# Altium footprint library ICs_imp.PCBLIB: 118 footprints (part 3 of 8)
Each footprint in its own frame and in the unit in brackets; x right, y up, seen from the top. Pads: shape width x height; smd on the part's side, far side on the other; paste and mask are expansions set on the pad; w line width, h text height; cw(c..) or ccw(c..) is an arc to the next point about the centre after c.
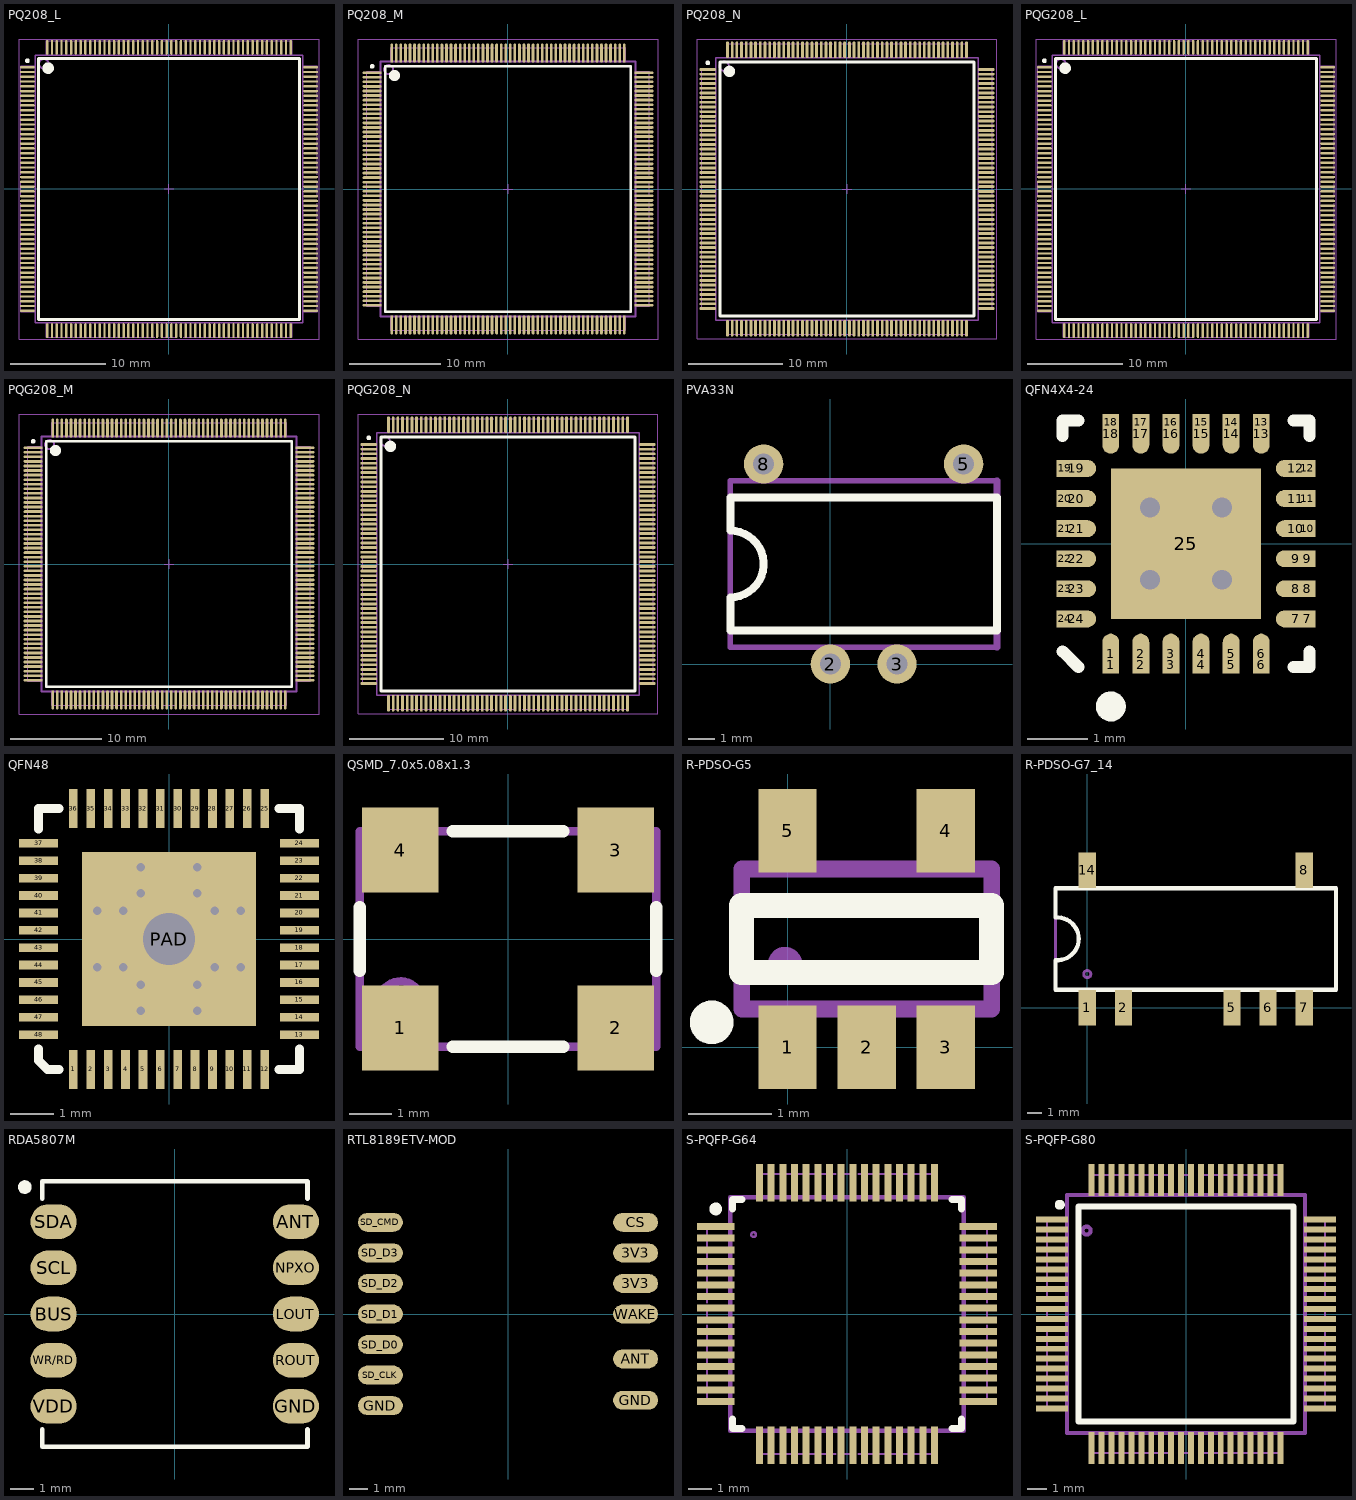
[diagram p2: the footprints below, top view; thin cyan lines are the x and y axes]

## PQ208_L [mm] "Shrink QFP, 208-Leads, Body 28x28mm, Pitch 0.5mm, IPC High Density"
height 4.1
pads (208):
  oval 1.55x0.25 smd: 1(-14.825,12.75) 2(-14.825,12.25) 3(-14.825,11.75) 4(-14.825,11.25) 5(-14.825,10.75) 6(-14.825,10.25) 7(-14.825,9.75) 8(-14.825,9.25) 9(-14.825,8.75) 10(-14.825,8.25) 11(-14.825,7.75) 12(-14.825,7.25) 13(-14.825,6.75) 14(-14.825,6.25) 15(-14.825,5.75) 16(-14.825,5.25) 17(-14.825,4.75) 18(-14.825,4.25) 19(-14.825,3.75) 20(-14.825,3.25) 21(-14.825,2.75) 22(-14.825,2.25) 23(-14.825,1.75) 24(-14.825,1.25) 25(-14.825,0.75) 26(-14.825,0.25) 27(-14.825,-0.25) 28(-14.825,-0.75) 29(-14.825,-1.25) 30(-14.825,-1.75) 31(-14.825,-2.25) 32(-14.825,-2.75) 33(-14.825,-3.25) 34(-14.825,-3.75) 35(-14.825,-4.25) 36(-14.825,-4.75) 37(-14.825,-5.25) 38(-14.825,-5.75) 39(-14.825,-6.25) 40(-14.825,-6.75) 41(-14.825,-7.25) 42(-14.825,-7.75) 43(-14.825,-8.25) 44(-14.825,-8.75) 45(-14.825,-9.25) 46(-14.825,-9.75) 47(-14.825,-10.25) 48(-14.825,-10.75) 49(-14.825,-11.25) 50(-14.825,-11.75) 51(-14.825,-12.25) 52(-14.825,-12.75) 105(14.825,-12.75) 106(14.825,-12.25) 107(14.825,-11.75) 108(14.825,-11.25) 109(14.825,-10.75) 110(14.825,-10.25) 111(14.825,-9.75) 112(14.825,-9.25) 113(14.825,-8.75) 114(14.825,-8.25) 115(14.825,-7.75) 116(14.825,-7.25) 117(14.825,-6.75) 118(14.825,-6.25) 119(14.825,-5.75) 120(14.825,-5.25) 121(14.825,-4.75) 122(14.825,-4.25) 123(14.825,-3.75) 124(14.825,-3.25) 125(14.825,-2.75) 126(14.825,-2.25) 127(14.825,-1.75) 128(14.825,-1.25) 129(14.825,-0.75) 130(14.825,-0.25) 131(14.825,0.25) 132(14.825,0.75) 133(14.825,1.25) 134(14.825,1.75) 135(14.825,2.25) 136(14.825,2.75) 137(14.825,3.25) 138(14.825,3.75) 139(14.825,4.25) 140(14.825,4.75) 141(14.825,5.25) 142(14.825,5.75) 143(14.825,6.25) 144(14.825,6.75) 145(14.825,7.25) 146(14.825,7.75) 147(14.825,8.25) 148(14.825,8.75) 149(14.825,9.25) 150(14.825,9.75) 151(14.825,10.25) 152(14.825,10.75) 153(14.825,11.25) 154(14.825,11.75) 155(14.825,12.25) 156(14.825,12.75)
  oval 0.25x1.55 smd: 53(-12.75,-14.825) 54(-12.25,-14.825) 55(-11.75,-14.825) 56(-11.25,-14.825) 57(-10.75,-14.825) 58(-10.25,-14.825) 59(-9.75,-14.825) 60(-9.25,-14.825) 61(-8.75,-14.825) 62(-8.25,-14.825) 63(-7.75,-14.825) 64(-7.25,-14.825) 65(-6.75,-14.825) 66(-6.25,-14.825) 67(-5.75,-14.825) 68(-5.25,-14.825) 69(-4.75,-14.825) 70(-4.25,-14.825) 71(-3.75,-14.825) 72(-3.25,-14.825) 73(-2.75,-14.825) 74(-2.25,-14.825) 75(-1.75,-14.825) 76(-1.25,-14.825) 77(-0.75,-14.825) 78(-0.25,-14.825) 79(0.25,-14.825) 80(0.75,-14.825) 81(1.25,-14.825) 82(1.75,-14.825) 83(2.25,-14.825) 84(2.75,-14.825) 85(3.25,-14.825) 86(3.75,-14.825) 87(4.25,-14.825) 88(4.75,-14.825) 89(5.25,-14.825) 90(5.75,-14.825) 91(6.25,-14.825) 92(6.75,-14.825) 93(7.25,-14.825) 94(7.75,-14.825) 95(8.25,-14.825) 96(8.75,-14.825) 97(9.25,-14.825) 98(9.75,-14.825) 99(10.25,-14.825) 100(10.75,-14.825) 101(11.25,-14.825) 102(11.75,-14.825) 103(12.25,-14.825) 104(12.75,-14.825) 157(12.75,14.825) 158(12.25,14.825) 159(11.75,14.825) 160(11.25,14.825) 161(10.75,14.825) 162(10.25,14.825) 163(9.75,14.825) 164(9.25,14.825) 165(8.75,14.825) 166(8.25,14.825) 167(7.75,14.825) 168(7.25,14.825) 169(6.75,14.825) 170(6.25,14.825) 171(5.75,14.825) 172(5.25,14.825) 173(4.75,14.825) 174(4.25,14.825) 175(3.75,14.825) 176(3.25,14.825) 177(2.75,14.825) 178(2.25,14.825) 179(1.75,14.825) 180(1.25,14.825) 181(0.75,14.825) 182(0.25,14.825) 183(-0.25,14.825) 184(-0.75,14.825) 185(-1.25,14.825) 186(-1.75,14.825) 187(-2.25,14.825) 188(-2.75,14.825) 189(-3.25,14.825) 190(-3.75,14.825) 191(-4.25,14.825) 192(-4.75,14.825) 193(-5.25,14.825) 194(-5.75,14.825) 195(-6.25,14.825) 196(-6.75,14.825) 197(-7.25,14.825) 198(-7.75,14.825) 199(-8.25,14.825) 200(-8.75,14.825) 201(-9.25,14.825) 202(-9.75,14.825) 203(-10.25,14.825) 204(-10.75,14.825) 205(-11.25,14.825) 206(-11.75,14.825) 207(-12.25,14.825) 208(-12.75,14.825)
Top Overlay:
  circle w0.6: c-12.65,12.65 r0.3
  circle w0.25: c-14.825,13.425 r0.125
  lines w0.3: -13.65,-13.65 13.65,-13.65 13.65,13.65 -13.65,13.65 -13.65,-13.65
Mechanical 1:
  circle w0.2: c-13.1,13.1 r0.5
  lines w0.1: -15.494,-12.827 -15.494,-1.5 ; -15.494,-0.762 -15.494,0.762 ; -15.494,1.5 -15.494,12.827 ; -12.827,-15.494 -1.5,-15.494 ; -12.827,15.494 -1.5,15.494 ; -0.762,-15.494 0.762,-15.494 ; -0.762,15.494 0.762,15.494 ; 1.5,-15.494 12.827,-15.494 ; 1.5,15.494 12.827,15.494 ; 15.494,-12.827 15.494,-1.5 ; 15.494,-0.762 15.494,0.762 ; 15.494,1.5 15.494,12.827
  lines w0.2: -15.494,-12.827 -14,-12.827 ; -15.494,12.827 -14,12.827 ; -12.827,-15.494 -12.827,-14 ; -12.827,14 -12.827,15.494 ; 12.827,-15.494 12.827,-14 ; 12.827,14 12.827,15.494 ; 14,-12.827 15.494,-12.827 ; 14,12.827 15.494,12.827 ; -14,-14 14,-14 14,14 -14,14 -14,-14
  text ".Comment" at -2.9,-1.7 h1.5
  text ".Designator" at -1.61,0.85 h1.5
Mechanical 15:
  lines w0.1: -0.5,0 0.5,0 ; 0,-0.5 0,0.5 ; -15.7,-15.7 15.7,-15.7 15.7,15.7 -15.7,15.7 -15.7,-15.7
3D body: height 4.1, standoff 0, extent -14,-14 14,14

## PQ208_M [mm] "Shrink QFP, 208-Leads, Body 28x28mm, Pitch 0.5mm, IPC Low Density"
height 4.1
pads (208):
  oval 2.1x0.3 smd: 1(-14.9,12.75) 2(-14.9,12.25) 3(-14.9,11.75) 4(-14.9,11.25) 5(-14.9,10.75) 6(-14.9,10.25) 7(-14.9,9.75) 8(-14.9,9.25) 9(-14.9,8.75) 10(-14.9,8.25) 11(-14.9,7.75) 12(-14.9,7.25) 13(-14.9,6.75) 14(-14.9,6.25) 15(-14.9,5.75) 16(-14.9,5.25) 17(-14.9,4.75) 18(-14.9,4.25) 19(-14.9,3.75) 20(-14.9,3.25) 21(-14.9,2.75) 22(-14.9,2.25) 23(-14.9,1.75) 24(-14.9,1.25) 25(-14.9,0.75) 26(-14.9,0.25) 27(-14.9,-0.25) 28(-14.9,-0.75) 29(-14.9,-1.25) 30(-14.9,-1.75) 31(-14.9,-2.25) 32(-14.9,-2.75) 33(-14.9,-3.25) 34(-14.9,-3.75) 35(-14.9,-4.25) 36(-14.9,-4.75) 37(-14.9,-5.25) 38(-14.9,-5.75) 39(-14.9,-6.25) 40(-14.9,-6.75) 41(-14.9,-7.25) 42(-14.9,-7.75) 43(-14.9,-8.25) 44(-14.9,-8.75) 45(-14.9,-9.25) 46(-14.9,-9.75) 47(-14.9,-10.25) 48(-14.9,-10.75) 49(-14.9,-11.25) 50(-14.9,-11.75) 51(-14.9,-12.25) 52(-14.9,-12.75) 105(14.9,-12.75) 106(14.9,-12.25) 107(14.9,-11.75) 108(14.9,-11.25) 109(14.9,-10.75) 110(14.9,-10.25) 111(14.9,-9.75) 112(14.9,-9.25) 113(14.9,-8.75) 114(14.9,-8.25) 115(14.9,-7.75) 116(14.9,-7.25) 117(14.9,-6.75) 118(14.9,-6.25) 119(14.9,-5.75) 120(14.9,-5.25) 121(14.9,-4.75) 122(14.9,-4.25) 123(14.9,-3.75) 124(14.9,-3.25) 125(14.9,-2.75) 126(14.9,-2.25) 127(14.9,-1.75) 128(14.9,-1.25) 129(14.9,-0.75) 130(14.9,-0.25) 131(14.9,0.25) 132(14.9,0.75) 133(14.9,1.25) 134(14.9,1.75) 135(14.9,2.25) 136(14.9,2.75) 137(14.9,3.25) 138(14.9,3.75) 139(14.9,4.25) 140(14.9,4.75) 141(14.9,5.25) 142(14.9,5.75) 143(14.9,6.25) 144(14.9,6.75) 145(14.9,7.25) 146(14.9,7.75) 147(14.9,8.25) 148(14.9,8.75) 149(14.9,9.25) 150(14.9,9.75) 151(14.9,10.25) 152(14.9,10.75) 153(14.9,11.25) 154(14.9,11.75) 155(14.9,12.25) 156(14.9,12.75)
  oval 0.3x2.1 smd: 53(-12.75,-14.9) 54(-12.25,-14.9) 55(-11.75,-14.9) 56(-11.25,-14.9) 57(-10.75,-14.9) 58(-10.25,-14.9) 59(-9.75,-14.9) 60(-9.25,-14.9) 61(-8.75,-14.9) 62(-8.25,-14.9) 63(-7.75,-14.9) 64(-7.25,-14.9) 65(-6.75,-14.9) 66(-6.25,-14.9) 67(-5.75,-14.9) 68(-5.25,-14.9) 69(-4.75,-14.9) 70(-4.25,-14.9) 71(-3.75,-14.9) 72(-3.25,-14.9) 73(-2.75,-14.9) 74(-2.25,-14.9) 75(-1.75,-14.9) 76(-1.25,-14.9) 77(-0.75,-14.9) 78(-0.25,-14.9) 79(0.25,-14.9) 80(0.75,-14.9) 81(1.25,-14.9) 82(1.75,-14.9) 83(2.25,-14.9) 84(2.75,-14.9) 85(3.25,-14.9) 86(3.75,-14.9) 87(4.25,-14.9) 88(4.75,-14.9) 89(5.25,-14.9) 90(5.75,-14.9) 91(6.25,-14.9) 92(6.75,-14.9) 93(7.25,-14.9) 94(7.75,-14.9) 95(8.25,-14.9) 96(8.75,-14.9) 97(9.25,-14.9) 98(9.75,-14.9) 99(10.25,-14.9) 100(10.75,-14.9) 101(11.25,-14.9) 102(11.75,-14.9) 103(12.25,-14.9) 104(12.75,-14.9) 157(12.75,14.9) 158(12.25,14.9) 159(11.75,14.9) 160(11.25,14.9) 161(10.75,14.9) 162(10.25,14.9) 163(9.75,14.9) 164(9.25,14.9) 165(8.75,14.9) 166(8.25,14.9) 167(7.75,14.9) 168(7.25,14.9) 169(6.75,14.9) 170(6.25,14.9) 171(5.75,14.9) 172(5.25,14.9) 173(4.75,14.9) 174(4.25,14.9) 175(3.75,14.9) 176(3.25,14.9) 177(2.75,14.9) 178(2.25,14.9) 179(1.75,14.9) 180(1.25,14.9) 181(0.75,14.9) 182(0.25,14.9) 183(-0.25,14.9) 184(-0.75,14.9) 185(-1.25,14.9) 186(-1.75,14.9) 187(-2.25,14.9) 188(-2.75,14.9) 189(-3.25,14.9) 190(-3.75,14.9) 191(-4.25,14.9) 192(-4.75,14.9) 193(-5.25,14.9) 194(-5.75,14.9) 195(-6.25,14.9) 196(-6.75,14.9) 197(-7.25,14.9) 198(-7.75,14.9) 199(-8.25,14.9) 200(-8.75,14.9) 201(-9.25,14.9) 202(-9.75,14.9) 203(-10.25,14.9) 204(-10.75,14.9) 205(-11.25,14.9) 206(-11.75,14.9) 207(-12.25,14.9) 208(-12.75,14.9)
Top Overlay:
  circle w0.6: c-12.45,12.45 r0.3
  circle w0.25: c-14.9,13.45 r0.125
  lines w0.3: -13.45,-13.45 13.45,-13.45 13.45,13.45 -13.45,13.45 -13.45,-13.45
Mechanical 1:
  circle w0.2: c-13.1,13.1 r0.5
  lines w0.1: -15.494,-12.827 -15.494,-1.5 ; -15.494,-0.762 -15.494,0.762 ; -15.494,1.5 -15.494,12.827 ; -12.827,-15.494 -1.5,-15.494 ; -12.827,15.494 -1.5,15.494 ; -0.762,-15.494 0.762,-15.494 ; -0.762,15.494 0.762,15.494 ; 1.5,-15.494 12.827,-15.494 ; 1.5,15.494 12.827,15.494 ; 15.494,-12.827 15.494,-1.5 ; 15.494,-0.762 15.494,0.762 ; 15.494,1.5 15.494,12.827
  lines w0.2: -15.494,-12.827 -14,-12.827 ; -15.494,12.827 -14,12.827 ; -12.827,-15.494 -12.827,-14 ; -12.827,14 -12.827,15.494 ; 12.827,-15.494 12.827,-14 ; 12.827,14 12.827,15.494 ; 14,-12.827 15.494,-12.827 ; 14,12.827 15.494,12.827 ; -14,-14 14,-14 14,14 -14,14 -14,-14
  text ".Designator" at -1.61,0.85 h1.5
  text ".Comment" at -2.9,-1.7 h1.5
Mechanical 15:
  lines w0.1: -0.5,0 0.5,0 ; 0,-0.5 0,0.5 ; -16.45,-16.45 16.45,-16.45 16.45,16.45 -16.45,16.45 -16.45,-16.45
3D body: height 4.1, standoff 0, extent -14,-14 14,14

## PQ208_N [mm] "Shrink QFP, 208-Leads, Body 28x28mm, Pitch 0.5mm, IPC Medium Density"
height 4.1
pads (208):
  oval 1.8x0.3 smd: 1(-14.85,12.75) 2(-14.85,12.25) 3(-14.85,11.75) 4(-14.85,11.25) 5(-14.85,10.75) 6(-14.85,10.25) 7(-14.85,9.75) 8(-14.85,9.25) 9(-14.85,8.75) 10(-14.85,8.25) 11(-14.85,7.75) 12(-14.85,7.25) 13(-14.85,6.75) 14(-14.85,6.25) 15(-14.85,5.75) 16(-14.85,5.25) 17(-14.85,4.75) 18(-14.85,4.25) 19(-14.85,3.75) 20(-14.85,3.25) 21(-14.85,2.75) 22(-14.85,2.25) 23(-14.85,1.75) 24(-14.85,1.25) 25(-14.85,0.75) 26(-14.85,0.25) 27(-14.85,-0.25) 28(-14.85,-0.75) 29(-14.85,-1.25) 30(-14.85,-1.75) 31(-14.85,-2.25) 32(-14.85,-2.75) 33(-14.85,-3.25) 34(-14.85,-3.75) 35(-14.85,-4.25) 36(-14.85,-4.75) 37(-14.85,-5.25) 38(-14.85,-5.75) 39(-14.85,-6.25) 40(-14.85,-6.75) 41(-14.85,-7.25) 42(-14.85,-7.75) 43(-14.85,-8.25) 44(-14.85,-8.75) 45(-14.85,-9.25) 46(-14.85,-9.75) 47(-14.85,-10.25) 48(-14.85,-10.75) 49(-14.85,-11.25) 50(-14.85,-11.75) 51(-14.85,-12.25) 52(-14.85,-12.75) 105(14.85,-12.75) 106(14.85,-12.25) 107(14.85,-11.75) 108(14.85,-11.25) 109(14.85,-10.75) 110(14.85,-10.25) 111(14.85,-9.75) 112(14.85,-9.25) 113(14.85,-8.75) 114(14.85,-8.25) 115(14.85,-7.75) 116(14.85,-7.25) 117(14.85,-6.75) 118(14.85,-6.25) 119(14.85,-5.75) 120(14.85,-5.25) 121(14.85,-4.75) 122(14.85,-4.25) 123(14.85,-3.75) 124(14.85,-3.25) 125(14.85,-2.75) 126(14.85,-2.25) 127(14.85,-1.75) 128(14.85,-1.25) 129(14.85,-0.75) 130(14.85,-0.25) 131(14.85,0.25) 132(14.85,0.75) 133(14.85,1.25) 134(14.85,1.75) 135(14.85,2.25) 136(14.85,2.75) 137(14.85,3.25) 138(14.85,3.75) 139(14.85,4.25) 140(14.85,4.75) 141(14.85,5.25) 142(14.85,5.75) 143(14.85,6.25) 144(14.85,6.75) 145(14.85,7.25) 146(14.85,7.75) 147(14.85,8.25) 148(14.85,8.75) 149(14.85,9.25) 150(14.85,9.75) 151(14.85,10.25) 152(14.85,10.75) 153(14.85,11.25) 154(14.85,11.75) 155(14.85,12.25) 156(14.85,12.75)
  oval 0.3x1.8 smd: 53(-12.75,-14.85) 54(-12.25,-14.85) 55(-11.75,-14.85) 56(-11.25,-14.85) 57(-10.75,-14.85) 58(-10.25,-14.85) 59(-9.75,-14.85) 60(-9.25,-14.85) 61(-8.75,-14.85) 62(-8.25,-14.85) 63(-7.75,-14.85) 64(-7.25,-14.85) 65(-6.75,-14.85) 66(-6.25,-14.85) 67(-5.75,-14.85) 68(-5.25,-14.85) 69(-4.75,-14.85) 70(-4.25,-14.85) 71(-3.75,-14.85) 72(-3.25,-14.85) 73(-2.75,-14.85) 74(-2.25,-14.85) 75(-1.75,-14.85) 76(-1.25,-14.85) 77(-0.75,-14.85) 78(-0.25,-14.85) 79(0.25,-14.85) 80(0.75,-14.85) 81(1.25,-14.85) 82(1.75,-14.85) 83(2.25,-14.85) 84(2.75,-14.85) 85(3.25,-14.85) 86(3.75,-14.85) 87(4.25,-14.85) 88(4.75,-14.85) 89(5.25,-14.85) 90(5.75,-14.85) 91(6.25,-14.85) 92(6.75,-14.85) 93(7.25,-14.85) 94(7.75,-14.85) 95(8.25,-14.85) 96(8.75,-14.85) 97(9.25,-14.85) 98(9.75,-14.85) 99(10.25,-14.85) 100(10.75,-14.85) 101(11.25,-14.85) 102(11.75,-14.85) 103(12.25,-14.85) 104(12.75,-14.85) 157(12.75,14.85) 158(12.25,14.85) 159(11.75,14.85) 160(11.25,14.85) 161(10.75,14.85) 162(10.25,14.85) 163(9.75,14.85) 164(9.25,14.85) 165(8.75,14.85) 166(8.25,14.85) 167(7.75,14.85) 168(7.25,14.85) 169(6.75,14.85) 170(6.25,14.85) 171(5.75,14.85) 172(5.25,14.85) 173(4.75,14.85) 174(4.25,14.85) 175(3.75,14.85) 176(3.25,14.85) 177(2.75,14.85) 178(2.25,14.85) 179(1.75,14.85) 180(1.25,14.85) 181(0.75,14.85) 182(0.25,14.85) 183(-0.25,14.85) 184(-0.75,14.85) 185(-1.25,14.85) 186(-1.75,14.85) 187(-2.25,14.85) 188(-2.75,14.85) 189(-3.25,14.85) 190(-3.75,14.85) 191(-4.25,14.85) 192(-4.75,14.85) 193(-5.25,14.85) 194(-5.75,14.85) 195(-6.25,14.85) 196(-6.75,14.85) 197(-7.25,14.85) 198(-7.75,14.85) 199(-8.25,14.85) 200(-8.75,14.85) 201(-9.25,14.85) 202(-9.75,14.85) 203(-10.25,14.85) 204(-10.75,14.85) 205(-11.25,14.85) 206(-11.75,14.85) 207(-12.25,14.85) 208(-12.75,14.85)
Top Overlay:
  circle w0.6: c-12.55,12.55 r0.3
  circle w0.25: c-14.85,13.45 r0.125
  lines w0.3: -13.55,-13.55 13.55,-13.55 13.55,13.55 -13.55,13.55 -13.55,-13.55
Mechanical 1:
  circle w0.2: c-13.1,13.1 r0.5
  lines w0.1: -15.494,-12.827 -15.494,-1.5 ; -15.494,-0.762 -15.494,0.762 ; -15.494,1.5 -15.494,12.827 ; -12.827,-15.494 -1.5,-15.494 ; -12.827,15.494 -1.5,15.494 ; -0.762,-15.494 0.762,-15.494 ; -0.762,15.494 0.762,15.494 ; 1.5,-15.494 12.827,-15.494 ; 1.5,15.494 12.827,15.494 ; 15.494,-12.827 15.494,-1.5 ; 15.494,-0.762 15.494,0.762 ; 15.494,1.5 15.494,12.827
  lines w0.2: -15.494,-12.827 -14,-12.827 ; -15.494,12.827 -14,12.827 ; -12.827,-15.494 -12.827,-14 ; -12.827,14 -12.827,15.494 ; 12.827,-15.494 12.827,-14 ; 12.827,14 12.827,15.494 ; 14,-12.827 15.494,-12.827 ; 14,12.827 15.494,12.827 ; -14,-14 14,-14 14,14 -14,14 -14,-14
  text ".Designator" at -1.61,0.85 h1.5
  text ".Comment" at -2.9,-1.7 h1.5
Mechanical 15:
  lines w0.1: -0.5,0 0.5,0 ; 0,-0.5 0,0.5 ; -16,-16 16,-16 16,16 -16,16 -16,-16
3D body: height 4.1, standoff 0, extent -14,-14 14,14

## PQG208_L [mm] "Shrink QFP, 208-Leads, Body 28x28mm, Pitch 0.5mm, IPC High Density"
height 4.1
pads (208):
  oval 1.55x0.25 smd: 1(-14.825,12.75) 2(-14.825,12.25) 3(-14.825,11.75) 4(-14.825,11.25) 5(-14.825,10.75) 6(-14.825,10.25) 7(-14.825,9.75) 8(-14.825,9.25) 9(-14.825,8.75) 10(-14.825,8.25) 11(-14.825,7.75) 12(-14.825,7.25) 13(-14.825,6.75) 14(-14.825,6.25) 15(-14.825,5.75) 16(-14.825,5.25) 17(-14.825,4.75) 18(-14.825,4.25) 19(-14.825,3.75) 20(-14.825,3.25) 21(-14.825,2.75) 22(-14.825,2.25) 23(-14.825,1.75) 24(-14.825,1.25) 25(-14.825,0.75) 26(-14.825,0.25) 27(-14.825,-0.25) 28(-14.825,-0.75) 29(-14.825,-1.25) 30(-14.825,-1.75) 31(-14.825,-2.25) 32(-14.825,-2.75) 33(-14.825,-3.25) 34(-14.825,-3.75) 35(-14.825,-4.25) 36(-14.825,-4.75) 37(-14.825,-5.25) 38(-14.825,-5.75) 39(-14.825,-6.25) 40(-14.825,-6.75) 41(-14.825,-7.25) 42(-14.825,-7.75) 43(-14.825,-8.25) 44(-14.825,-8.75) 45(-14.825,-9.25) 46(-14.825,-9.75) 47(-14.825,-10.25) 48(-14.825,-10.75) 49(-14.825,-11.25) 50(-14.825,-11.75) 51(-14.825,-12.25) 52(-14.825,-12.75) 105(14.825,-12.75) 106(14.825,-12.25) 107(14.825,-11.75) 108(14.825,-11.25) 109(14.825,-10.75) 110(14.825,-10.25) 111(14.825,-9.75) 112(14.825,-9.25) 113(14.825,-8.75) 114(14.825,-8.25) 115(14.825,-7.75) 116(14.825,-7.25) 117(14.825,-6.75) 118(14.825,-6.25) 119(14.825,-5.75) 120(14.825,-5.25) 121(14.825,-4.75) 122(14.825,-4.25) 123(14.825,-3.75) 124(14.825,-3.25) 125(14.825,-2.75) 126(14.825,-2.25) 127(14.825,-1.75) 128(14.825,-1.25) 129(14.825,-0.75) 130(14.825,-0.25) 131(14.825,0.25) 132(14.825,0.75) 133(14.825,1.25) 134(14.825,1.75) 135(14.825,2.25) 136(14.825,2.75) 137(14.825,3.25) 138(14.825,3.75) 139(14.825,4.25) 140(14.825,4.75) 141(14.825,5.25) 142(14.825,5.75) 143(14.825,6.25) 144(14.825,6.75) 145(14.825,7.25) 146(14.825,7.75) 147(14.825,8.25) 148(14.825,8.75) 149(14.825,9.25) 150(14.825,9.75) 151(14.825,10.25) 152(14.825,10.75) 153(14.825,11.25) 154(14.825,11.75) 155(14.825,12.25) 156(14.825,12.75)
  oval 0.25x1.55 smd: 53(-12.75,-14.825) 54(-12.25,-14.825) 55(-11.75,-14.825) 56(-11.25,-14.825) 57(-10.75,-14.825) 58(-10.25,-14.825) 59(-9.75,-14.825) 60(-9.25,-14.825) 61(-8.75,-14.825) 62(-8.25,-14.825) 63(-7.75,-14.825) 64(-7.25,-14.825) 65(-6.75,-14.825) 66(-6.25,-14.825) 67(-5.75,-14.825) 68(-5.25,-14.825) 69(-4.75,-14.825) 70(-4.25,-14.825) 71(-3.75,-14.825) 72(-3.25,-14.825) 73(-2.75,-14.825) 74(-2.25,-14.825) 75(-1.75,-14.825) 76(-1.25,-14.825) 77(-0.75,-14.825) 78(-0.25,-14.825) 79(0.25,-14.825) 80(0.75,-14.825) 81(1.25,-14.825) 82(1.75,-14.825) 83(2.25,-14.825) 84(2.75,-14.825) 85(3.25,-14.825) 86(3.75,-14.825) 87(4.25,-14.825) 88(4.75,-14.825) 89(5.25,-14.825) 90(5.75,-14.825) 91(6.25,-14.825) 92(6.75,-14.825) 93(7.25,-14.825) 94(7.75,-14.825) 95(8.25,-14.825) 96(8.75,-14.825) 97(9.25,-14.825) 98(9.75,-14.825) 99(10.25,-14.825) 100(10.75,-14.825) 101(11.25,-14.825) 102(11.75,-14.825) 103(12.25,-14.825) 104(12.75,-14.825) 157(12.75,14.825) 158(12.25,14.825) 159(11.75,14.825) 160(11.25,14.825) 161(10.75,14.825) 162(10.25,14.825) 163(9.75,14.825) 164(9.25,14.825) 165(8.75,14.825) 166(8.25,14.825) 167(7.75,14.825) 168(7.25,14.825) 169(6.75,14.825) 170(6.25,14.825) 171(5.75,14.825) 172(5.25,14.825) 173(4.75,14.825) 174(4.25,14.825) 175(3.75,14.825) 176(3.25,14.825) 177(2.75,14.825) 178(2.25,14.825) 179(1.75,14.825) 180(1.25,14.825) 181(0.75,14.825) 182(0.25,14.825) 183(-0.25,14.825) 184(-0.75,14.825) 185(-1.25,14.825) 186(-1.75,14.825) 187(-2.25,14.825) 188(-2.75,14.825) 189(-3.25,14.825) 190(-3.75,14.825) 191(-4.25,14.825) 192(-4.75,14.825) 193(-5.25,14.825) 194(-5.75,14.825) 195(-6.25,14.825) 196(-6.75,14.825) 197(-7.25,14.825) 198(-7.75,14.825) 199(-8.25,14.825) 200(-8.75,14.825) 201(-9.25,14.825) 202(-9.75,14.825) 203(-10.25,14.825) 204(-10.75,14.825) 205(-11.25,14.825) 206(-11.75,14.825) 207(-12.25,14.825) 208(-12.75,14.825)
Top Overlay:
  circle w0.6: c-12.65,12.65 r0.3
  circle w0.25: c-14.825,13.425 r0.125
  lines w0.3: -13.65,-13.65 13.65,-13.65 13.65,13.65 -13.65,13.65 -13.65,-13.65
Mechanical 1:
  circle w0.2: c-13.1,13.1 r0.5
  lines w0.1: -15.494,-12.827 -15.494,-1.5 ; -15.494,-0.762 -15.494,0.762 ; -15.494,1.5 -15.494,12.827 ; -12.827,-15.494 -1.5,-15.494 ; -12.827,15.494 -1.5,15.494 ; -0.762,-15.494 0.762,-15.494 ; -0.762,15.494 0.762,15.494 ; 1.5,-15.494 12.827,-15.494 ; 1.5,15.494 12.827,15.494 ; 15.494,-12.827 15.494,-1.5 ; 15.494,-0.762 15.494,0.762 ; 15.494,1.5 15.494,12.827
  lines w0.2: -15.494,-12.827 -14,-12.827 ; -15.494,12.827 -14,12.827 ; -12.827,-15.494 -12.827,-14 ; -12.827,14 -12.827,15.494 ; 12.827,-15.494 12.827,-14 ; 12.827,14 12.827,15.494 ; 14,-12.827 15.494,-12.827 ; 14,12.827 15.494,12.827 ; -14,-14 14,-14 14,14 -14,14 -14,-14
  text ".Designator" at -1.61,0.85 h1.5
  text ".Comment" at -2.9,-1.7 h1.5
Mechanical 15:
  lines w0.1: -0.5,0 0.5,0 ; 0,-0.5 0,0.5 ; -15.7,-15.7 15.7,-15.7 15.7,15.7 -15.7,15.7 -15.7,-15.7
3D body: height 4.1, standoff 0, extent -14,-14 14,14

## PQG208_M [mm] "Shrink QFP, 208-Leads, Body 28x28mm, Pitch 0.5mm, IPC Low Density"
height 4.1
pads (208):
  oval 2.1x0.3 smd: 1(-14.9,12.75) 2(-14.9,12.25) 3(-14.9,11.75) 4(-14.9,11.25) 5(-14.9,10.75) 6(-14.9,10.25) 7(-14.9,9.75) 8(-14.9,9.25) 9(-14.9,8.75) 10(-14.9,8.25) 11(-14.9,7.75) 12(-14.9,7.25) 13(-14.9,6.75) 14(-14.9,6.25) 15(-14.9,5.75) 16(-14.9,5.25) 17(-14.9,4.75) 18(-14.9,4.25) 19(-14.9,3.75) 20(-14.9,3.25) 21(-14.9,2.75) 22(-14.9,2.25) 23(-14.9,1.75) 24(-14.9,1.25) 25(-14.9,0.75) 26(-14.9,0.25) 27(-14.9,-0.25) 28(-14.9,-0.75) 29(-14.9,-1.25) 30(-14.9,-1.75) 31(-14.9,-2.25) 32(-14.9,-2.75) 33(-14.9,-3.25) 34(-14.9,-3.75) 35(-14.9,-4.25) 36(-14.9,-4.75) 37(-14.9,-5.25) 38(-14.9,-5.75) 39(-14.9,-6.25) 40(-14.9,-6.75) 41(-14.9,-7.25) 42(-14.9,-7.75) 43(-14.9,-8.25) 44(-14.9,-8.75) 45(-14.9,-9.25) 46(-14.9,-9.75) 47(-14.9,-10.25) 48(-14.9,-10.75) 49(-14.9,-11.25) 50(-14.9,-11.75) 51(-14.9,-12.25) 52(-14.9,-12.75) 105(14.9,-12.75) 106(14.9,-12.25) 107(14.9,-11.75) 108(14.9,-11.25) 109(14.9,-10.75) 110(14.9,-10.25) 111(14.9,-9.75) 112(14.9,-9.25) 113(14.9,-8.75) 114(14.9,-8.25) 115(14.9,-7.75) 116(14.9,-7.25) 117(14.9,-6.75) 118(14.9,-6.25) 119(14.9,-5.75) 120(14.9,-5.25) 121(14.9,-4.75) 122(14.9,-4.25) 123(14.9,-3.75) 124(14.9,-3.25) 125(14.9,-2.75) 126(14.9,-2.25) 127(14.9,-1.75) 128(14.9,-1.25) 129(14.9,-0.75) 130(14.9,-0.25) 131(14.9,0.25) 132(14.9,0.75) 133(14.9,1.25) 134(14.9,1.75) 135(14.9,2.25) 136(14.9,2.75) 137(14.9,3.25) 138(14.9,3.75) 139(14.9,4.25) 140(14.9,4.75) 141(14.9,5.25) 142(14.9,5.75) 143(14.9,6.25) 144(14.9,6.75) 145(14.9,7.25) 146(14.9,7.75) 147(14.9,8.25) 148(14.9,8.75) 149(14.9,9.25) 150(14.9,9.75) 151(14.9,10.25) 152(14.9,10.75) 153(14.9,11.25) 154(14.9,11.75) 155(14.9,12.25) 156(14.9,12.75)
  oval 0.3x2.1 smd: 53(-12.75,-14.9) 54(-12.25,-14.9) 55(-11.75,-14.9) 56(-11.25,-14.9) 57(-10.75,-14.9) 58(-10.25,-14.9) 59(-9.75,-14.9) 60(-9.25,-14.9) 61(-8.75,-14.9) 62(-8.25,-14.9) 63(-7.75,-14.9) 64(-7.25,-14.9) 65(-6.75,-14.9) 66(-6.25,-14.9) 67(-5.75,-14.9) 68(-5.25,-14.9) 69(-4.75,-14.9) 70(-4.25,-14.9) 71(-3.75,-14.9) 72(-3.25,-14.9) 73(-2.75,-14.9) 74(-2.25,-14.9) 75(-1.75,-14.9) 76(-1.25,-14.9) 77(-0.75,-14.9) 78(-0.25,-14.9) 79(0.25,-14.9) 80(0.75,-14.9) 81(1.25,-14.9) 82(1.75,-14.9) 83(2.25,-14.9) 84(2.75,-14.9) 85(3.25,-14.9) 86(3.75,-14.9) 87(4.25,-14.9) 88(4.75,-14.9) 89(5.25,-14.9) 90(5.75,-14.9) 91(6.25,-14.9) 92(6.75,-14.9) 93(7.25,-14.9) 94(7.75,-14.9) 95(8.25,-14.9) 96(8.75,-14.9) 97(9.25,-14.9) 98(9.75,-14.9) 99(10.25,-14.9) 100(10.75,-14.9) 101(11.25,-14.9) 102(11.75,-14.9) 103(12.25,-14.9) 104(12.75,-14.9) 157(12.75,14.9) 158(12.25,14.9) 159(11.75,14.9) 160(11.25,14.9) 161(10.75,14.9) 162(10.25,14.9) 163(9.75,14.9) 164(9.25,14.9) 165(8.75,14.9) 166(8.25,14.9) 167(7.75,14.9) 168(7.25,14.9) 169(6.75,14.9) 170(6.25,14.9) 171(5.75,14.9) 172(5.25,14.9) 173(4.75,14.9) 174(4.25,14.9) 175(3.75,14.9) 176(3.25,14.9) 177(2.75,14.9) 178(2.25,14.9) 179(1.75,14.9) 180(1.25,14.9) 181(0.75,14.9) 182(0.25,14.9) 183(-0.25,14.9) 184(-0.75,14.9) 185(-1.25,14.9) 186(-1.75,14.9) 187(-2.25,14.9) 188(-2.75,14.9) 189(-3.25,14.9) 190(-3.75,14.9) 191(-4.25,14.9) 192(-4.75,14.9) 193(-5.25,14.9) 194(-5.75,14.9) 195(-6.25,14.9) 196(-6.75,14.9) 197(-7.25,14.9) 198(-7.75,14.9) 199(-8.25,14.9) 200(-8.75,14.9) 201(-9.25,14.9) 202(-9.75,14.9) 203(-10.25,14.9) 204(-10.75,14.9) 205(-11.25,14.9) 206(-11.75,14.9) 207(-12.25,14.9) 208(-12.75,14.9)
Top Overlay:
  circle w0.6: c-12.45,12.45 r0.3
  circle w0.25: c-14.9,13.45 r0.125
  lines w0.3: -13.45,-13.45 13.45,-13.45 13.45,13.45 -13.45,13.45 -13.45,-13.45
Mechanical 1:
  circle w0.2: c-13.1,13.1 r0.5
  lines w0.1: -15.494,-12.827 -15.494,-1.5 ; -15.494,-0.762 -15.494,0.762 ; -15.494,1.5 -15.494,12.827 ; -12.827,-15.494 -1.5,-15.494 ; -12.827,15.494 -1.5,15.494 ; -0.762,-15.494 0.762,-15.494 ; -0.762,15.494 0.762,15.494 ; 1.5,-15.494 12.827,-15.494 ; 1.5,15.494 12.827,15.494 ; 15.494,-12.827 15.494,-1.5 ; 15.494,-0.762 15.494,0.762 ; 15.494,1.5 15.494,12.827
  lines w0.2: -15.494,-12.827 -14,-12.827 ; -15.494,12.827 -14,12.827 ; -12.827,-15.494 -12.827,-14 ; -12.827,14 -12.827,15.494 ; 12.827,-15.494 12.827,-14 ; 12.827,14 12.827,15.494 ; 14,-12.827 15.494,-12.827 ; 14,12.827 15.494,12.827 ; -14,-14 14,-14 14,14 -14,14 -14,-14
  text ".Designator" at -1.61,0.85 h1.5
  text ".Comment" at -2.9,-1.7 h1.5
Mechanical 15:
  lines w0.1: -0.5,0 0.5,0 ; 0,-0.5 0,0.5 ; -16.45,-16.45 16.45,-16.45 16.45,16.45 -16.45,16.45 -16.45,-16.45
3D body: height 4.1, standoff 0, extent -14,-14 14,14

## PQG208_N [mm] "Shrink QFP, 208-Leads, Body 28x28mm, Pitch 0.5mm, IPC Medium Density"
height 4.1
pads (208):
  oval 1.8x0.3 smd: 1(-14.85,12.75) 2(-14.85,12.25) 3(-14.85,11.75) 4(-14.85,11.25) 5(-14.85,10.75) 6(-14.85,10.25) 7(-14.85,9.75) 8(-14.85,9.25) 9(-14.85,8.75) 10(-14.85,8.25) 11(-14.85,7.75) 12(-14.85,7.25) 13(-14.85,6.75) 14(-14.85,6.25) 15(-14.85,5.75) 16(-14.85,5.25) 17(-14.85,4.75) 18(-14.85,4.25) 19(-14.85,3.75) 20(-14.85,3.25) 21(-14.85,2.75) 22(-14.85,2.25) 23(-14.85,1.75) 24(-14.85,1.25) 25(-14.85,0.75) 26(-14.85,0.25) 27(-14.85,-0.25) 28(-14.85,-0.75) 29(-14.85,-1.25) 30(-14.85,-1.75) 31(-14.85,-2.25) 32(-14.85,-2.75) 33(-14.85,-3.25) 34(-14.85,-3.75) 35(-14.85,-4.25) 36(-14.85,-4.75) 37(-14.85,-5.25) 38(-14.85,-5.75) 39(-14.85,-6.25) 40(-14.85,-6.75) 41(-14.85,-7.25) 42(-14.85,-7.75) 43(-14.85,-8.25) 44(-14.85,-8.75) 45(-14.85,-9.25) 46(-14.85,-9.75) 47(-14.85,-10.25) 48(-14.85,-10.75) 49(-14.85,-11.25) 50(-14.85,-11.75) 51(-14.85,-12.25) 52(-14.85,-12.75) 105(14.85,-12.75) 106(14.85,-12.25) 107(14.85,-11.75) 108(14.85,-11.25) 109(14.85,-10.75) 110(14.85,-10.25) 111(14.85,-9.75) 112(14.85,-9.25) 113(14.85,-8.75) 114(14.85,-8.25) 115(14.85,-7.75) 116(14.85,-7.25) 117(14.85,-6.75) 118(14.85,-6.25) 119(14.85,-5.75) 120(14.85,-5.25) 121(14.85,-4.75) 122(14.85,-4.25) 123(14.85,-3.75) 124(14.85,-3.25) 125(14.85,-2.75) 126(14.85,-2.25) 127(14.85,-1.75) 128(14.85,-1.25) 129(14.85,-0.75) 130(14.85,-0.25) 131(14.85,0.25) 132(14.85,0.75) 133(14.85,1.25) 134(14.85,1.75) 135(14.85,2.25) 136(14.85,2.75) 137(14.85,3.25) 138(14.85,3.75) 139(14.85,4.25) 140(14.85,4.75) 141(14.85,5.25) 142(14.85,5.75) 143(14.85,6.25) 144(14.85,6.75) 145(14.85,7.25) 146(14.85,7.75) 147(14.85,8.25) 148(14.85,8.75) 149(14.85,9.25) 150(14.85,9.75) 151(14.85,10.25) 152(14.85,10.75) 153(14.85,11.25) 154(14.85,11.75) 155(14.85,12.25) 156(14.85,12.75)
  oval 0.3x1.8 smd: 53(-12.75,-14.85) 54(-12.25,-14.85) 55(-11.75,-14.85) 56(-11.25,-14.85) 57(-10.75,-14.85) 58(-10.25,-14.85) 59(-9.75,-14.85) 60(-9.25,-14.85) 61(-8.75,-14.85) 62(-8.25,-14.85) 63(-7.75,-14.85) 64(-7.25,-14.85) 65(-6.75,-14.85) 66(-6.25,-14.85) 67(-5.75,-14.85) 68(-5.25,-14.85) 69(-4.75,-14.85) 70(-4.25,-14.85) 71(-3.75,-14.85) 72(-3.25,-14.85) 73(-2.75,-14.85) 74(-2.25,-14.85) 75(-1.75,-14.85) 76(-1.25,-14.85) 77(-0.75,-14.85) 78(-0.25,-14.85) 79(0.25,-14.85) 80(0.75,-14.85) 81(1.25,-14.85) 82(1.75,-14.85) 83(2.25,-14.85) 84(2.75,-14.85) 85(3.25,-14.85) 86(3.75,-14.85) 87(4.25,-14.85) 88(4.75,-14.85) 89(5.25,-14.85) 90(5.75,-14.85) 91(6.25,-14.85) 92(6.75,-14.85) 93(7.25,-14.85) 94(7.75,-14.85) 95(8.25,-14.85) 96(8.75,-14.85) 97(9.25,-14.85) 98(9.75,-14.85) 99(10.25,-14.85) 100(10.75,-14.85) 101(11.25,-14.85) 102(11.75,-14.85) 103(12.25,-14.85) 104(12.75,-14.85) 157(12.75,14.85) 158(12.25,14.85) 159(11.75,14.85) 160(11.25,14.85) 161(10.75,14.85) 162(10.25,14.85) 163(9.75,14.85) 164(9.25,14.85) 165(8.75,14.85) 166(8.25,14.85) 167(7.75,14.85) 168(7.25,14.85) 169(6.75,14.85) 170(6.25,14.85) 171(5.75,14.85) 172(5.25,14.85) 173(4.75,14.85) 174(4.25,14.85) 175(3.75,14.85) 176(3.25,14.85) 177(2.75,14.85) 178(2.25,14.85) 179(1.75,14.85) 180(1.25,14.85) 181(0.75,14.85) 182(0.25,14.85) 183(-0.25,14.85) 184(-0.75,14.85) 185(-1.25,14.85) 186(-1.75,14.85) 187(-2.25,14.85) 188(-2.75,14.85) 189(-3.25,14.85) 190(-3.75,14.85) 191(-4.25,14.85) 192(-4.75,14.85) 193(-5.25,14.85) 194(-5.75,14.85) 195(-6.25,14.85) 196(-6.75,14.85) 197(-7.25,14.85) 198(-7.75,14.85) 199(-8.25,14.85) 200(-8.75,14.85) 201(-9.25,14.85) 202(-9.75,14.85) 203(-10.25,14.85) 204(-10.75,14.85) 205(-11.25,14.85) 206(-11.75,14.85) 207(-12.25,14.85) 208(-12.75,14.85)
Top Overlay:
  circle w0.25: c-14.85,13.45 r0.125
  circle w0.6: c-12.55,12.55 r0.3
  lines w0.3: -13.55,-13.55 13.55,-13.55 13.55,13.55 -13.55,13.55 -13.55,-13.55
Mechanical 1:
  circle w0.2: c-13.1,13.1 r0.5
  lines w0.1: -15.494,-12.827 -15.494,-1.5 ; -15.494,-0.762 -15.494,0.762 ; -15.494,1.5 -15.494,12.827 ; -12.827,-15.494 -1.5,-15.494 ; -12.827,15.494 -1.5,15.494 ; -0.762,-15.494 0.762,-15.494 ; -0.762,15.494 0.762,15.494 ; 1.5,-15.494 12.827,-15.494 ; 1.5,15.494 12.827,15.494 ; 15.494,-12.827 15.494,-1.5 ; 15.494,-0.762 15.494,0.762 ; 15.494,1.5 15.494,12.827
  lines w0.2: -15.494,-12.827 -14,-12.827 ; -15.494,12.827 -14,12.827 ; -12.827,-15.494 -12.827,-14 ; -12.827,14 -12.827,15.494 ; 12.827,-15.494 12.827,-14 ; 12.827,14 12.827,15.494 ; 14,-12.827 15.494,-12.827 ; 14,12.827 15.494,12.827 ; -14,-14 14,-14 14,14 -14,14 -14,-14
  text ".Designator" at -1.61,0.85 h1.5
  text ".Comment" at -2.9,-1.7 h1.5
Mechanical 15:
  lines w0.1: -0.5,0 0.5,0 ; 0,-0.5 0,0.5 ; -16,-16 16,-16 16,16 -16,16 -16,-16
3D body: height 4.1, standoff 0, extent -14,-14 14,14

## PVA33N [mm]
height 4.6
pads (4):
  round 1.5 hole 0.8: 2(0,0) 3(2.54,0) 5(5.08,7.62) 8(-2.54,7.62)
Top Overlay:
  lines w0.3: -3.81,1.27 6.35,1.27 6.35,6.35 -3.81,6.35 -3.81,5.08 cw(c-3.81,3.81) -3.81,2.54 -3.81,1.27
Mechanical 1:
  lines w0.025: -3.81,2.54 ccw(c-3.81,3.81) -3.81,5.08
  lines w0.2: -2.54,6.985 -2.54,7.62 ; 0,0 0,0.635 ; 2.54,0 2.54,0.635 ; 5.08,6.985 5.08,7.62 ; 6.35,0.635 -3.81,0.635 -3.81,6.985 6.35,6.985
  lines w0.25: 6.35,0.635 6.35,6.985
  text ".Designator" at 0.14,4.54 h1.5
  text ".Comment" at -1.45,2.84 h1.5
  text "8" at -2.73,5.64 h1.5
  text "8" at -2.73,5.64 h1.5
  text "5" at 4.89,5.64 h1.5
  text "3" at 2.35,1.195 h1.5
  text "2" at -0.317,1.195 h1.5
3D body "PVA33N.stp": height 4.6, standoff -3, extent -3.425,-0.125 5.975,7.745

## QFN4X4-24 [mm] "Quad Flat No Lead, Plastic; 24 Terminals; Body 4 x 4 mm; Pitch 0.5 mm"
height 0.8
pads (49):
  rect 0.28x0.28 smd mask+0.11: 1(-1.25,-2.015) 2(-0.75,-2.015) 3(-0.25,-2.015) 4(0.25,-2.015) 5(0.75,-2.015) 6(1.25,-2.015) 7(2.015,-1.25) 8(2.015,-0.75) 9(2.015,-0.25) 10(2.015,0.25) 11(2.015,0.75) 12(2.015,1.25) 13(1.25,2.015) 14(0.75,2.015) 15(0.25,2.015) 16(-0.25,2.015) 17(-0.75,2.015) 18(-1.25,2.015) 19(-2.015,1.25) 20(-2.015,0.75) 21(-2.015,0.25) 22(-2.015,-0.25) 23(-2.015,-0.75) 24(-2.015,-1.25)
  oval 0.28x0.66 smd mask+0.11: 1(-1.25,-1.825) 2(-0.75,-1.825) 3(-0.25,-1.825) 4(0.25,-1.825) 5(0.75,-1.825) 6(1.25,-1.825) 13(1.25,1.825) 14(0.75,1.825) 15(0.25,1.825) 16(-0.25,1.825) 17(-0.75,1.825) 18(-1.25,1.825)
  oval 0.66x0.28 smd mask+0.11: 7(1.825,-1.25) 8(1.825,-0.75) 9(1.825,-0.25) 10(1.825,0.25) 11(1.825,0.75) 12(1.825,1.25) 19(-1.825,1.25) 20(-1.825,0.75) 21(-1.825,0.25) 22(-1.825,-0.25) 23(-1.825,-0.75) 24(-1.825,-1.25)
  rect 2.5x2.5 smd: 25(0,0)
via -0.6,-0.6 diameter 0.66 hole 0.33
via 0.6,-0.6 diameter 0.66 hole 0.33
via 0.6,0.6 diameter 0.66 hole 0.33
via -0.6,0.6 diameter 0.66 hole 0.33
Top Overlay:
  circle w0.25: c-1.25,-2.705 r0.125
  lines w0.2: -2.05,-1.79 -1.79,-2.05 ; -2.05,1.79 -2.05,2.05 -1.79,2.05 ; 1.79,-2.05 2.05,-2.05 2.05,-1.79 ; 1.79,2.05 2.05,2.05 2.05,1.79
3D body "User Library-QFN 24 4x4.step": height 0.91, standoff 0.01, extent -2.002,-2.002 2.002,2.002

## QFN48 [mm] "QFN48"
pads (49):
  rect 0.2x0.9 smd: 1(-2.2,-3) 2(-1.8,-3) 3(-1.4,-3) 4(-1,-3) 5(-0.6,-3) 6(-0.2,-3) 7(0.2,-3) 8(0.6,-3) 9(1,-3) 10(1.4,-3) 11(1.8,-3) 12(2.2,-3) 25(2.2,3) 26(1.8,3) 27(1.4,3) 28(1,3) 29(0.6,3) 30(0.2,3) 31(-0.2,3) 32(-0.6,3) 33(-1,3) 34(-1.4,3) 35(-1.8,3) 36(-2.2,3)
  rect 0.9x0.2 smd: 13(3,-2.2) 14(3,-1.8) 15(3,-1.4) 16(3,-1) 17(3,-0.6) 18(3,-0.2) 19(3,0.2) 20(3,0.6) 21(3,1) 22(3,1.4) 23(3,1.8) 24(3,2.2) 37(-3,2.2) 38(-3,1.8) 39(-3,1.4) 40(-3,1) 41(-3,0.6) 42(-3,0.2) 43(-3,-0.2) 44(-3,-0.6) 45(-3,-1) 46(-3,-1.4) 47(-3,-1.8) 48(-3,-2.2)
  rect 4x4 smd: PAD(0,0)
via 0,0 diameter 1.6 hole 1.2
via -1.65,0.65 diameter 0.4 hole 0.2
via -1.05,0.65 diameter 0.4 hole 0.2
via -1.65,-0.65 diameter 0.4 hole 0.2
via -1.05,-0.65 diameter 0.4 hole 0.2
via -0.65,-1.65 diameter 0.4 hole 0.2
via -0.65,-1.05 diameter 0.4 hole 0.2
via 0.65,-1.65 diameter 0.4 hole 0.2
via 0.65,-1.05 diameter 0.4 hole 0.2
via 1.65,-0.65 diameter 0.4 hole 0.2
via 1.05,-0.65 diameter 0.4 hole 0.2
via 1.65,0.65 diameter 0.4 hole 0.2
via 1.05,0.65 diameter 0.4 hole 0.2
via -0.65,1.65 diameter 0.4 hole 0.2
via -0.65,1.05 diameter 0.4 hole 0.2
via 0.65,1.65 diameter 0.4 hole 0.2
via 0.65,1.05 diameter 0.4 hole 0.2
Bottom Layer:
  region: -0.85,1.85 -0.85,0.85 -1.85,0.85 -1.85,0.45 -0.85,0.45 -0.85,-0.45 -1.85,-0.45 -1.85,-0.85 -0.85,-0.85 -0.85,-1.85 -0.45,-1.85 -0.45,-0.85 0.45,-0.85 0.45,-1.85 0.85,-1.85 0.85,-0.85 1.85,-0.85 1.85,-0.45 0.85,-0.45 0.85,0.45 1.85,0.45 1.85,0.85 0.85,0.85 0.85,1.85 0.45,1.85 0.45,0.85 -0.45,0.85 -0.45,1.85
Top Overlay:
  lines w0.203: -3,-2.525 -3,-2.8 -2.8,-3 -2.525,-3 ; -3,2.525 -3,3 -2.525,3 ; 2.525,-3 3,-3 3,-2.525 ; 2.525,3 3,3 3,2.525
Top Paste:
  rectangle: 0.8,0.8 1.8,1.8
  rectangle: -0.5,0.8 0.5,1.8
  rectangle: -1.8,0.8 -0.8,1.8
  rectangle: 0.8,-0.5 1.8,0.5
  rectangle: 0.8,-1.8 1.8,-0.8
  rectangle: -1.8,-1.8 -0.8,-0.8
  rectangle: -0.5,-1.8 0.5,-0.8
  rectangle: -1.8,-0.5 -0.8,0.5
3D body: height 0.75, standoff 0.05, extent -3,-3 3,3

## QSMD_7.0x5.08x1.3 [mm]
height 1.3
pads (4):
  rect 1.8x2 smd: 1(-2.54,-2.1) 2(2.54,-2.1) 3(2.54,2.1) 4(-2.54,2.1)
Top Overlay:
  lines w0.3: -3.5,-0.75 -3.5,0.75 ; -1.3,-2.54 1.3,-2.54 ; -1.3,2.54 1.3,2.54 ; 3.5,-0.75 3.5,0.75
Mechanical 1:
  circle w0.2: c-2.54,-1.5 r0.5
  lines w0.2: -3.5,-2.54 -2.84,-2.54 cw(c-2.54,-2.54) -2.24,-2.54 2.24,-2.54 cw(c2.54,-2.54) 2.84,-2.54 3.5,-2.54 3.5,2.54 2.84,2.54 cw(c2.54,2.54) 2.24,2.54 -2.24,2.54 cw(c-2.54,2.54) -2.84,2.54 -3.5,2.54 -3.5,-2.54
  text ".Designator" at -3.075,0.8 h1.5
  text ".Comment" at -3.025,-0.65 h1.5
  text "1" at -2.875,-5.05 h1.5
  text "2" at 2.1,-5.1 h1.5
  text "3" at 2.05,3.425 h1.5
  text "4" at -3.125,3.425 h1.5

## R-PDSO-G5 [mm]
height 1.45
pads (5):
  rect 0.7x1 smd: 1(0,0) 2(0.95,0) 3(1.9,0) 4(1.9,2.6) 5(0,2.6)
Top Overlay:
  circle w0.3: c-0.912,0.3 r0.112
  lines w0.3: -0.55,0.9 2.45,0.9 2.45,1.7 -0.55,1.7 -0.55,0.9
Mechanical 1:
  circle w0.25: c-0.03,1 r0.08
  lines w0.2: 0,-0.2 0,0.45 ; 0,2.15 0,2.8 ; 1.9,-0.2 1.9,0.46 ; 1.9,2.15 1.9,2.8 ; -0.55,0.46 -0.55,2.14 2.45,2.14 2.45,0.46 -0.55,0.46 ; 0.95,-0.2 0.95,0.45 0.95,-0.2
  text "5" at -1.1,2.35 h1.5
  text ".Comment" at -1.72,-1.44 h1.5
  text ".Designator" at -0.02,3.16 h1.5
3D body "R-PDSO-G5.stp": height 1.46, standoff 0, extent -0.5,-0.2 2.4,2.8

## R-PDSO-G7_14 [mm]
height 5.33
pads (7):
  rect 1.2x2.5 smd: 1(0,0) 2(2.54,0) 5(10.16,0) 6(12.7,0) 7(15.24,0) 8(15.24,9.652) 14(0,9.652)
Top Overlay:
  lines w0.3: -2.23,3.342 -2.23,1.266 17.47,1.266 17.47,8.386 -2.23,8.386 -2.23,6.33 cw(c-2.1,4.836) -2.229,3.342
Mechanical 1:
  circle w0.2: c0,2.361 r0.251
  lines w0.2: 0,-0.424 0,1.266 ; 0,8.386 0,10.076 ; 2.54,-0.424 2.54,1.266 ; 10.16,-0.424 10.16,1.266 ; 12.7,-0.424 12.7,1.266 ; 15.24,-0.424 15.24,1.266 ; 15.24,8.386 15.24,10.076 ; -2.23,1.266 -2.23,8.386 17.47,8.386 17.47,1.266 -2.23,1.266
  text "7" at 14.79,1.881 h1.5
  text "8" at 15.02,6.871 h1.5
  text "14" at -0.49,6.956 h1.5
  text ".Comment" at 4.5,3.411 h1.5
  text ".Designator" at 6.4,5.511 h1.5
3D body "R-PDSO-G7_14.stp": height 5.33, standoff 0, extent -2.23,-0.424 17.47,10.076

## RDA5807M [mm]
height 2
pads (10):
  oval 2x1.5 smd: ANT(5.25,4) BUS(-5.25,0) GND(5.25,-4) LOUT(5.25,0) NPXO(5.25,2) ROUT(5.25,-2) SCL(-5.25,2) SDA(-5.25,4) VDD(-5.25,-4) WR/RD(-5.25,-2)
Top Overlay:
  circle w0.1: c-6.5,5.5 r0.25
  rectangle: -6.7,5.3 -6.3,5.7
  lines w0.2: -5.75,-5 -5.75,-5.75 5.75,-5.75 5.75,-5 ; -5.75,5 -5.75,5.75 5.75,5.75 5.75,5
3D body "RDA5807M.STEP": height 2.15, standoff 0, extent -5.5,-5.5 5.5,5.5

## RTL8189ETV-MOD [mm]
pads (13):
  oval 2.5x1.05 smd: 3V3(7.1,1.7) 3V3(7.1,3.4) ANT(7.1,-2.5) CS(7.1,5.1) GND(-7.1,-5.1) GND(7.1,-4.8) SD_CLK(-7.1,-3.4) SD_CMD(-7.1,5.1) SD_D0(-7.1,-1.7) SD_D1(-7.1,0) SD_D2(-7.1,1.7) SD_D3(-7.1,3.4) WAKE(7.1,0)
3D body: height 1, standoff 0, extent -7.1,-6.2 7.1,6.2
3D body: height 1.5, standoff 1, extent -4,-4 0,0
3D body: height 1.5, standoff 1, extent 1,2.5 5,5.5

## S-PQFP-G64 [mm] "QFN, 64-Leads, Body 9.1x9.1mm (max), Pitch 0.50mm, IPC Medium Density"
height 1.45
pads (64):
  rect 1.6x0.3 smd: 1(-5.625,3.75) 2(-5.625,3.25) 3(-5.625,2.75) 4(-5.625,2.25) 5(-5.625,1.75) 6(-5.625,1.25) 7(-5.625,0.75) 8(-5.625,0.25) 9(-5.625,-0.25) 10(-5.625,-0.75) 11(-5.625,-1.25) 12(-5.625,-1.75) 13(-5.625,-2.25) 14(-5.625,-2.75) 15(-5.625,-3.25) 16(-5.625,-3.75) 33(5.625,-3.75) 34(5.625,-3.25) 35(5.625,-2.75) 36(5.625,-2.25) 37(5.625,-1.75) 38(5.625,-1.25) 39(5.625,-0.75) 40(5.625,-0.25) 41(5.625,0.25) 42(5.625,0.75) 43(5.625,1.25) 44(5.625,1.75) 45(5.625,2.25) 46(5.625,2.75) 47(5.625,3.25) 48(5.625,3.75)
  rect 0.3x1.6 smd: 17(-3.75,-5.625) 18(-3.25,-5.625) 19(-2.75,-5.625) 20(-2.25,-5.625) 21(-1.75,-5.625) 22(-1.25,-5.625) 23(-0.75,-5.625) 24(-0.25,-5.625) 25(0.25,-5.625) 26(0.75,-5.625) 27(1.25,-5.625) 28(1.75,-5.625) 29(2.25,-5.625) 30(2.75,-5.625) 31(3.25,-5.625) 32(3.75,-5.625) 49(3.75,5.625) 50(3.25,5.625) 51(2.75,5.625) 52(2.25,5.625) 53(1.75,5.625) 54(1.25,5.625) 55(0.75,5.625) 56(0.25,5.625) 57(-0.25,5.625) 58(-0.75,5.625) 59(-1.25,5.625) 60(-1.75,5.625) 61(-2.25,5.625) 62(-2.75,5.625) 63(-3.25,5.625) 64(-3.75,5.625)
Top Overlay:
  circle w0.3: c-5.625,4.5 r0.125
  lines w0.3: -4.9,-4.5 -4.9,-4.9 -4.5,-4.9 ; -4.9,4.5 -4.9,4.9 -4.5,4.9 ; 4.5,-4.9 4.9,-4.9 4.9,-4.5 ; 4.5,4.9 4.9,4.9 4.9,4.5
Mechanical 1:
  circle w0.1: c-4,3.4 r0.1
  lines w0.1: -6,-3.75 -6,-0.5 ; -6,-0.125 -6,0.125 ; -6,0.5 -6,3.75 ; -3.75,-6 -0.5,-6 ; -3.75,6 -0.5,6 ; -0.125,-6 0.125,-6 ; -0.125,6 0.125,6 ; 0.5,-6 3.75,-6 ; 0.5,6 3.75,6 ; 6,-3.75 6,-0.5 ; 6,-0.125 6,0.125 ; 6,0.5 6,3.75
  lines w0.2: -6,-3.75 -5,-3.75 ; -6,3.75 -5,3.75 ; -3.75,-6 -3.75,-5 ; -3.75,5 -3.75,6 ; 3.75,-6 3.75,-5 ; 3.75,5 3.75,6 ; 5,-3.75 6,-3.75 ; 5,3.75 6,3.75 ; -5,-5 5,-5 5,5 -5,5 -5,-5
  text "64" at -3.429,3.429 h1.5
  text ".Comment" at -3.08,-1.05 h1.5
  text ".Designator" at -1.49,0.65 h1.5
3D body "S-PQFP-G64h1_45.stp": height 1.47, standoff 0, extent -6,-6 6,6

## S-PQFP-G80 [mm]
height 1.45
pads (80):
  rect 1.6x0.3 smd: 1(-6.75,4.75) 2(-6.75,4.25) 3(-6.75,3.75) 4(-6.75,3.25) 5(-6.75,2.75) 6(-6.75,2.25) 7(-6.75,1.75) 8(-6.75,1.25) 9(-6.75,0.75) 10(-6.75,0.25) 11(-6.75,-0.25) 12(-6.75,-0.75) 13(-6.75,-1.25) 14(-6.75,-1.75) 15(-6.75,-2.25) 16(-6.75,-2.75) 17(-6.75,-3.25) 18(-6.75,-3.75) 19(-6.75,-4.25) 20(-6.75,-4.75) 41(6.75,-4.75) 42(6.75,-4.25) 43(6.75,-3.75) 44(6.75,-3.25) 45(6.75,-2.75) 46(6.75,-2.25) 47(6.75,-1.75) 48(6.75,-1.25) 49(6.75,-0.75) 50(6.75,-0.25) 51(6.75,0.25) 52(6.75,0.75) 53(6.75,1.25) 54(6.75,1.75) 55(6.75,2.25) 56(6.75,2.75) 57(6.75,3.25) 58(6.75,3.75) 59(6.75,4.25) 60(6.75,4.75)
  rect 0.3x1.6 smd: 21(-4.75,-6.75) 22(-4.25,-6.75) 23(-3.75,-6.75) 24(-3.25,-6.75) 25(-2.75,-6.75) 26(-2.25,-6.75) 27(-1.75,-6.75) 28(-1.25,-6.75) 29(-0.75,-6.75) 30(-0.25,-6.75) 31(0.25,-6.75) 32(0.75,-6.75) 33(1.25,-6.75) 34(1.75,-6.75) 35(2.25,-6.75) 36(2.75,-6.75) 37(3.25,-6.75) 38(3.75,-6.75) 39(4.25,-6.75) 40(4.75,-6.75) 61(4.75,6.75) 62(4.25,6.75) 63(3.75,6.75) 64(3.25,6.75) 65(2.75,6.75) 66(2.25,6.75) 67(1.75,6.75) 68(1.25,6.75) 69(0.75,6.75) 70(0.25,6.75) 71(-0.25,6.75) 72(-0.75,6.75) 73(-1.25,6.75) 74(-1.75,6.75) 75(-2.25,6.75) 76(-2.75,6.75) 77(-3.25,6.75) 78(-3.75,6.75) 79(-4.25,6.75) 80(-4.75,6.75)
Top Overlay:
  circle w0.3: c-6.35,5.5 r0.1
  lines w0.3: -5.4,-5.4 5.4,-5.4 5.4,5.4 -5.4,5.4 -5.4,-5.4
Mechanical 1:
  lines w0.1: -7,-4.75 -7,-4.25 -7,-0.75 ; -7,-0.25 -7,0.25 ; -7,0.75 -7,4.75 ; -4.75,-7 -0.75,-7 ; -4.75,7 -4.25,7 -0.75,7 ; -0.25,-7 0.25,-7 ; -0.25,7 0.25,7 ; 0.75,-7 4.25,-7 4.75,-7 ; 0.75,7 4.75,7 ; 7,-4.75 7,-0.75 ; 7,-0.25 7,0.25 ; 7,0.75 7,4.25 7,4.75
  lines w0.2: -7,-4.75 -6,-4.75 ; -7,4.75 -6,4.75 ; -4.75,-7 -4.75,-6 ; -4.75,6 -4.75,7 ; 4.75,-7 4.75,-6 ; 4.75,6 4.75,7 ; 6,-4.75 7,-4.75 ; 6,4.75 7,4.75 ; -6,-6 6,-6 6,6 -6,6 -6,-6 ; -4.8,4.2 ccw(c-5,4.2) -4.8,4.2
  text ".Designator" at -1.28,0.23 h1.5
  text ".Comment" at -2.87,-1.47 h1.5
  text "80" at -4.6,4.4 h1.5
3D body "S-PQFP-G80h1_45.stp": height 1.47, standoff 0, extent -7,-7 7,7